# Altium footprint library UWRT_Footprint_Library_2020.PcbLib: 376 footprints (part 20 of 24)
Each footprint in its own frame and in the unit in brackets; x right, y up, seen from the top. Pads: shape width x height; smd on the part's side, far side on the other; paste and mask are expansions set on the pad; w line width, h text height; cw(c..) or ccw(c..) is an arc to the next point about the centre after c.
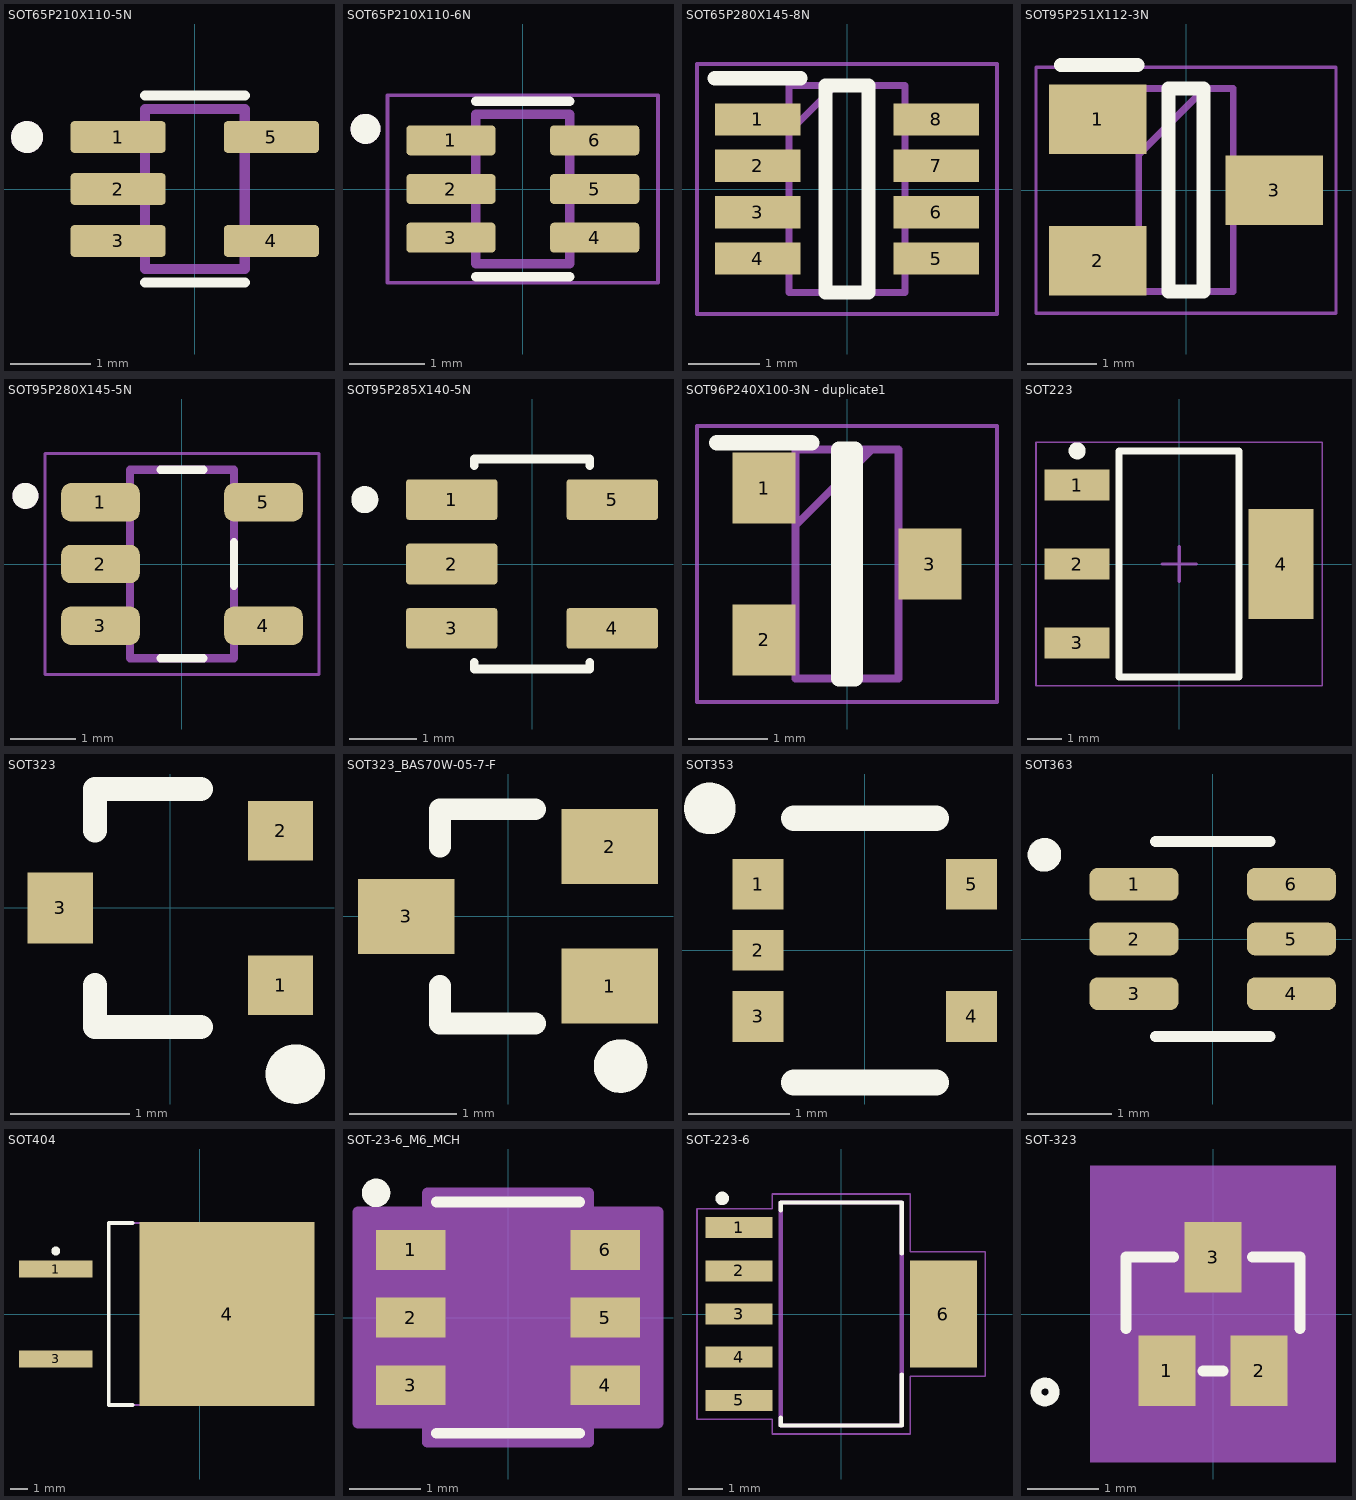
[diagram p19: the footprints below, top view; thin cyan lines are the x and y axes]

## SOT65P210X110-5N [mm]
pads (5):
  rrect25% 1.19x0.4 smd: 1(-0.96,0.65) 2(-0.96,0) 3(-0.96,-0.65) 4(0.96,-0.65) 5(0.96,0.65)
Top Overlay:
  circle w0.2: c-2.1,0.65 r0.1
  lines w0.127: -0.625,-1.17 0.625,-1.17 ; -0.625,1.17 0.625,1.17
Mechanical 13:
  circle w0.2: c-2.1,0.65 r0.1
  lines w0.127: -0.625,-1 -0.625,1 0.625,1 0.625,-1 -0.625,-1
3D body "step_temp.STEP": height 1.1, standoff 0, extent -1.05,-1 1.05,1

## SOT65P210X110-6N [mm]
pads (6):
  rrect25% 1.19x0.4 smd: 1(-0.96,0.65) 2(-0.96,0) 3(-0.96,-0.65) 4(0.96,-0.65) 5(0.96,0) 6(0.96,0.65)
Top Overlay:
  circle w0.2: c-2.1,0.802 r0.1
  lines w0.127: -0.625,-1.17 0.625,-1.17 ; -0.625,1.17 0.625,1.17
Mechanical 13:
  circle w0.2: c-2.1,0.802 r0.1
  lines w0.127: -0.625,-1 -0.625,1 0.625,1 0.625,-1 -0.625,-1
Mechanical 15:
  lines w0.05: -1.805,-1.25 -1.805,1.25 1.805,1.25 1.805,-1.25 -1.805,-1.25

## SOT65P280X145-8N [mm]
pads (8):
  rect 1.2x0.45 smd: 1(-1.25,0.975) 2(-1.25,0.325) 3(-1.25,-0.325) 4(-1.25,-0.975) 5(1.25,-0.975) 6(1.25,-0.325) 7(1.25,0.325) 8(1.25,0.975)
Top Overlay:
  lines w0.2: -1.85,1.55 -0.65,1.55 ; -0.3,-1.45 0.3,-1.45 0.3,1.45 -0.3,1.45 -0.3,-1.45
Mechanical 13:
  lines w0.1: -0.812,0.8 -0.162,1.45 ; -0.812,-1.45 0.812,-1.45 0.812,1.45 -0.812,1.45 -0.812,-1.45
Mechanical 15:
  lines w0.05: -2.1,-1.75 2.1,-1.75 2.1,1.75 -2.1,1.75 -2.1,-1.75
3D body "MAX33040EAKA+T.stp": height 1.45, standoff 0, extent -1.4,-1.45 1.4,1.45

## SOT95P251X112-3N [mm]
pads (3):
  rect 1.4x1 smd: 1(-1.27,1.016) 2(-1.27,-1.016) 3(1.27,0)
Top Overlay:
  lines w0.2: -1.8,1.8 -0.7,1.8 ; -0.254,-1.46 -0.254,1.46 0.25,1.46 0.25,-1.46 -0.254,-1.46
Mechanical 13:
  lines w0.1: -0.68,0.51 0.27,1.46 ; -0.68,-1.46 -0.68,1.46 0.68,1.46 0.68,-1.46 -0.68,-1.46
Mechanical 15:
  lines w0.05: -2.159,-1.77 2.159,-1.77 2.159,-0.676 2.159,0.676 2.159,1.77 -2.159,1.77 -2.159,0.676 -2.159,-0.676 -2.159,-1.77
3D body "NDS331N.stp": height 1.12, standoff 0, extent -1.255,-1.46 1.255,1.46

## SOT95P280X145-5N [mm]
pads (5):
  rrect50% 1.21x0.59 smd: 1(-1.255,0.95) 2(-1.255,0) 3(-1.255,-0.95) 4(1.255,-0.95) 5(1.255,0.95)
Top Overlay:
  circle w0.2: c-2.41,1.05 r0.1
  lines w0.127: -0.33,-1.45 0.33,-1.45 ; -0.33,1.45 0.33,1.45 ; 0.8,-0.335 0.8,0.335
Mechanical 13:
  circle w0.2: c-2.41,1.05 r0.1
  lines w0.127: -0.8,-1.45 -0.8,1.45 0.8,1.45 0.8,-1.45 -0.8,-1.45
Mechanical 15:
  lines w0.05: -2.11,-1.7 2.11,-1.7 2.11,1.7 -2.11,1.7 -2.11,-1.7
3D body "TPS2065CDBVT.STEP": height 1.45, standoff 0, extent -1.4,-1.45 1.4,1.45

## SOT95P285X140-5N [mm] "AP2112K-3.3TRG1 LDO"
pads (5):
  rrect15% 1.35x0.6 smd: 1(-1.185,0.95) 2(-1.185,0) 3(-1.185,-0.95) 4(1.185,-0.95) 5(1.185,0.95)
Top Overlay:
  circle w0.2: c-2.469,0.95 r0.1
  lines w0.127: -0.85,-1.45 -0.85,-1.55 0.85,-1.55 0.85,-1.45 ; -0.85,1.45 -0.85,1.55 0.85,1.55 0.85,1.45
3D body "AP2112K-3.3TRG1--3DModel-STEP-56544.STEP": height 1.4, standoff 0, extent -1.4,-1.5 1.4,1.5

## SOT96P240X100-3N - duplicate1 [mm]
pads (3):
  rect 0.8x0.9 smd: 1(-1.05,0.96) 2(-1.05,-0.96) 3(1.05,0)
Top Overlay:
  lines w0.2: -1.65,1.535 -0.45,1.535 ; -0.1,-1.45 0.1,-1.45 0.1,1.45 -0.1,1.45 -0.1,-1.45
Mechanical 13:
  lines w0.1: -0.65,0.49 0.31,1.45 ; -0.65,-1.45 0.65,-1.45 0.65,1.45 -0.65,1.45 -0.65,-1.45
Mechanical 15:
  lines w0.05: -1.9,-1.75 1.9,-1.75 1.9,1.75 -1.9,1.75 -1.9,-1.75
3D body "DMN65D8L-7.stp": height 1, standoff 0, extent -1.2,-1.45 1.2,1.45

## SOT223 [mm] "SOT223, 4-Leads, Body 6.50x7.00mm (avg), Pitch 2.30mm, IPC Medium Density"
height 1.65
pads (4):
  rect 1.9x0.9 smd: 1(-2.975,2.3) 2(-2.975,0) 3(-2.975,-2.3)
  rect 1.9x3.2 smd: 4(2.975,0)
Top Overlay:
  circle w0.25: c-2.975,3.3 r0.125
  lines w0.2: -1.75,-3.3 -1.75,3.3 1.75,3.3 1.75,-3.3 -1.75,-3.3
Mechanical 13:
  lines w0.1: -1.775,-3.275 -1.775,3.275 1.775,3.275 1.775,-3.275 -1.775,-3.275
Mechanical 15:
  lines w0.05: -4.175,-3.55 -4.175,3.55 4.175,3.55 4.175,-3.55 -4.175,-3.55
  lines w0.1: -0.5,0 0.5,0 ; 0,-0.5 0,0.5
3D body "CircuitWorks-SOT-223.STEP": height 1.65, standoff -0.03, extent -3.48,-3.25 3.48,3.25

## SOT323 [mm]
pads (3):
  rect 0.55x0.5 smd: 1(0.925,-0.65) 2(0.925,0.65)
  rect 0.55x0.6 smd: 3(-0.925,0)
Top Overlay:
  circle w0.25: c1.05,-1.397 r0.125
  lines w0.203: -0.635,-0.65 -0.635,-1 0.254,-1 ; -0.635,0.65 -0.635,1 0.254,1
3D body "NX3008NBKW,115--3DModel-STEP-56544.STEP": height 1.11, standoff 0.01, extent -1.05,-1 1.05,1

## SOT323_BAS70W-05-7-F [mm]
pads (3):
  rect 0.9x0.7 smd: 1(0.95,-0.65) 2(0.95,0.65) 3(-0.95,0)
Top Overlay:
  circle w0.25: c1.05,-1.397 r0.125
  lines w0.203: -0.635,-0.65 -0.635,-1 0.254,-1 ; -0.635,0.65 -0.635,1 0.254,1
3D body "NX3008NBKW,115--3DModel-STEP-56544.STEP": height 1.11, standoff 0.01, extent -1.05,-1 1.05,1

## SOT353 [mm] "TSSOP5, SC-70-5"
pads (5):
  rect 0.5x0.5 smd: 1(-1.05,0.65) 3(-1.05,-0.65) 4(1.05,-0.65) 5(1.05,0.65)
  rect 0.5x0.4 smd: 2(-1.05,0)
Top Overlay:
  circle w0.254: c-1.524,1.397 r0.127
  lines w0.254: -0.699,-1.3 0.699,-1.3 ; -0.699,1.3 0.699,1.3
3D body "User Library-SOT353-1.step": height 1.1, standoff 0, extent -1.2,-1.1 1.2,1.1

## SOT363 [mm]
pads (6):
  rrect50% 1.06x0.39 smd: 1(-0.935,0.65) 2(-0.935,0) 3(-0.935,-0.65) 4(0.935,-0.65) 5(0.935,0) 6(0.935,0.65)
Top Overlay:
  circle w0.2: c-2,1 r0.1
  lines w0.127: -0.68,-1.159 0.68,-1.159 ; -0.68,1.159 0.68,1.159
3D body "NTJD4001NT1G--3DModel-STEP-56544.STEP": height 1.01, standoff -0.09, extent -1.05,-1 1.05,1

## SOT404 [mm]
pads (3):
  rect 4.15x0.95 smd: 1(-8.155,2.54) 3(-8.155,-2.54)
  rect 9.9x10.4 smd: 4(1.545,0)
Top Overlay:
  circle w0.25: c-8.155,3.565 r0.125
  lines w0.2: -3.805,-5.15 -5.155,-5.15 -5.155,5.15 -3.805,5.15
Mechanical 13:
  lines w0.1: -5.155,-5.15 -5.155,5.15 4.645,5.15 4.645,-5.15 -5.155,-5.15
3D body: height 4.5, standoff 0, extent -5.155,-5.15 4.645,5.15

## SOT-23-6_M6_MCH [mil]
pads (6):
  rect 38.5x22 smd paste+0 mask+0: 1(-53.75,37.4) 2(-53.75,0) 3(-53.75,-37.4) 4(53.75,-37.4) 5(53.75,0) 6(53.75,37.4)
Top Overlay:
  circle w7.87: c-73,69 r3.94
  lines w6: -39.5,-64 39.5,-64 ; -39.5,64 39.5,64
Mechanical 13:
  lines w0: -12,59 ccw(c0,59) 12,59
  lines w1: -59,-47.4 -59,-27.4 -34.5,-27.4 -34.5,-47.4 -59,-47.4 ; -59,-10 -59,10 -34.5,10 -34.5,-10 -59,-10 ; -59,27.4 -59,47.4 -34.5,47.4 -34.5,27.4 -59,27.4 ; -34.5,-59 34.5,-59 34.5,59 -34.5,59 -34.5,-59 ; 34.5,-47.4 34.5,-27.4 59,-27.4 59,-47.4 34.5,-47.4 ; 34.5,-10 34.5,10 59,10 59,-10 34.5,-10 ; 34.5,27.4 34.5,47.4 59,47.4 59,27.4 34.5,27.4
  text "*" at -32,6 h50
Mechanical 15:
  region: -44.5,-58.4 -83,-58.4 -83,58.4 -44.5,58.4 -44.5,69 44.5,69 44.5,58.4 83,58.4 83,-58.4 44.5,-58.4 44.5,-69 -44.5,-69
  lines w6: -83,-58.4 -83,58.4 -44.5,58.4 -44.5,69 44.5,69 44.5,58.4 83,58.4 83,-58.4 44.5,-58.4 44.5,-69 -44.5,-69 -44.5,-58.4 -83,-58.4
3D body "SOT-23-6_M6_MCH.step": height 57.09, standoff 0, extent -59.02,-59.02 59.02,59.02

## SOT-223-6 [mm]
pads (6):
  rect 1.97x0.62 smd: 1(-3.005,2.54) 2(-3.005,1.27) 3(-3.005,0) 4(-3.005,-1.27) 5(-3.005,-2.54)
  rect 1.97x3.16 smd: 6(3.005,0)
Top Overlay:
  circle w0.2: c-3.5,3.4 r0.1
  lines w0.127: -1.78,-3.05 -1.78,-3.28 1.78,-3.28 1.78,-1.78 ; -1.78,3.05 -1.78,3.28 1.78,3.28 1.78,1.78
Mechanical 4:
  circle w0.2: c-3.5,2.54 r0.1
  circle w0.2: c-3.5,2.54 r0.1
  lines w0.127: -1.78,-3.28 1.78,-3.28 ; -1.78,-3.28 -1.78,3.28 ; -1.78,-3.28 1.78,-3.28 ; -1.78,-3.28 -1.78,3.28 ; -1.78,3.28 1.78,3.28 ; -1.78,3.28 1.78,3.28 ; 1.78,-3.28 1.78,3.28 ; 1.78,-3.28 1.78,3.28
Mechanical 16:
  lines w0.05: -4.24,-3.1 -4.24,3.1 -2.03,3.1 -2.03,3.53 2.03,3.53 2.03,1.83 4.24,1.83 4.24,-1.83 2.03,-1.83 2.03,-3.53 -2.03,-3.53 -2.03,-3.1 -4.24,-3.1
3D body "User Library-SOT-223-6.step": height 1.8, standoff 0, extent -3.63,-3.275 3.63,3.275

## SOT-323 [mm]
pads (3):
  rect 0.8x1 smd paste+0 mask+0.1: 1(-0.65,-0.8) 2(0.65,-0.8) 3(0,0.8)
Top Overlay:
  circle w0.152: c-2.37,-1.1 r0.127
  lines w0.152: -1.227,-0.204 -1.227,0.802 -0.558,0.802 ; -0.142,-0.802 0.142,-0.802 ; 0.558,0.802 1.227,0.802 1.227,-0.204
Mechanical 5:
  region: -1.735,2.091 1.735,2.091 1.735,-2.091 -1.735,-2.091
Mechanical 13:
  circle w0: c-0.846,-0.421 r0.127
  lines w0.025: -1.1,-0.675 -1.1,0.675 1.1,0.675 1.1,-0.675 -1.1,-0.675 ; -0.9,-1.1 -0.5,-1.1 -0.5,-0.675 -0.9,-0.675 -0.9,-1.1 ; -0.2,0.675 -0.2,1.1 0.2,1.1 0.2,0.675 -0.2,0.675 ; 0.5,-1.1 0.9,-1.1 0.9,-0.675 0.5,-0.675 0.5,-1.1
Mechanical 15:
  region: 1.1,-0.675 -1.1,-0.675 -1.1,0.675 1.1,0.675
  region: -1.354,-0.929 -1.354,0.929 -0.479,0.929 -0.479,1.71 0.479,1.71 0.479,0.929 1.354,0.929 1.354,-0.929 1.179,-0.929 1.179,-1.71 -1.179,-1.71 -1.179,-0.929
  lines w0.152: -1.354,-0.929 -1.179,-0.929 -1.179,-1.71 1.179,-1.71 1.179,-0.929 1.354,-0.929 1.354,0.929 0.479,0.929 0.479,1.71 -0.479,1.71 -0.479,0.929 -1.354,0.929 -1.354,-0.929
3D body "SOT-323_DIO.step": height 1, standoff 0, extent -1.1,-1.1 1.1,1.1